# Altium schematic symbol library GyokuRe.SchLib: 1131 symbols (part 5 of 8)
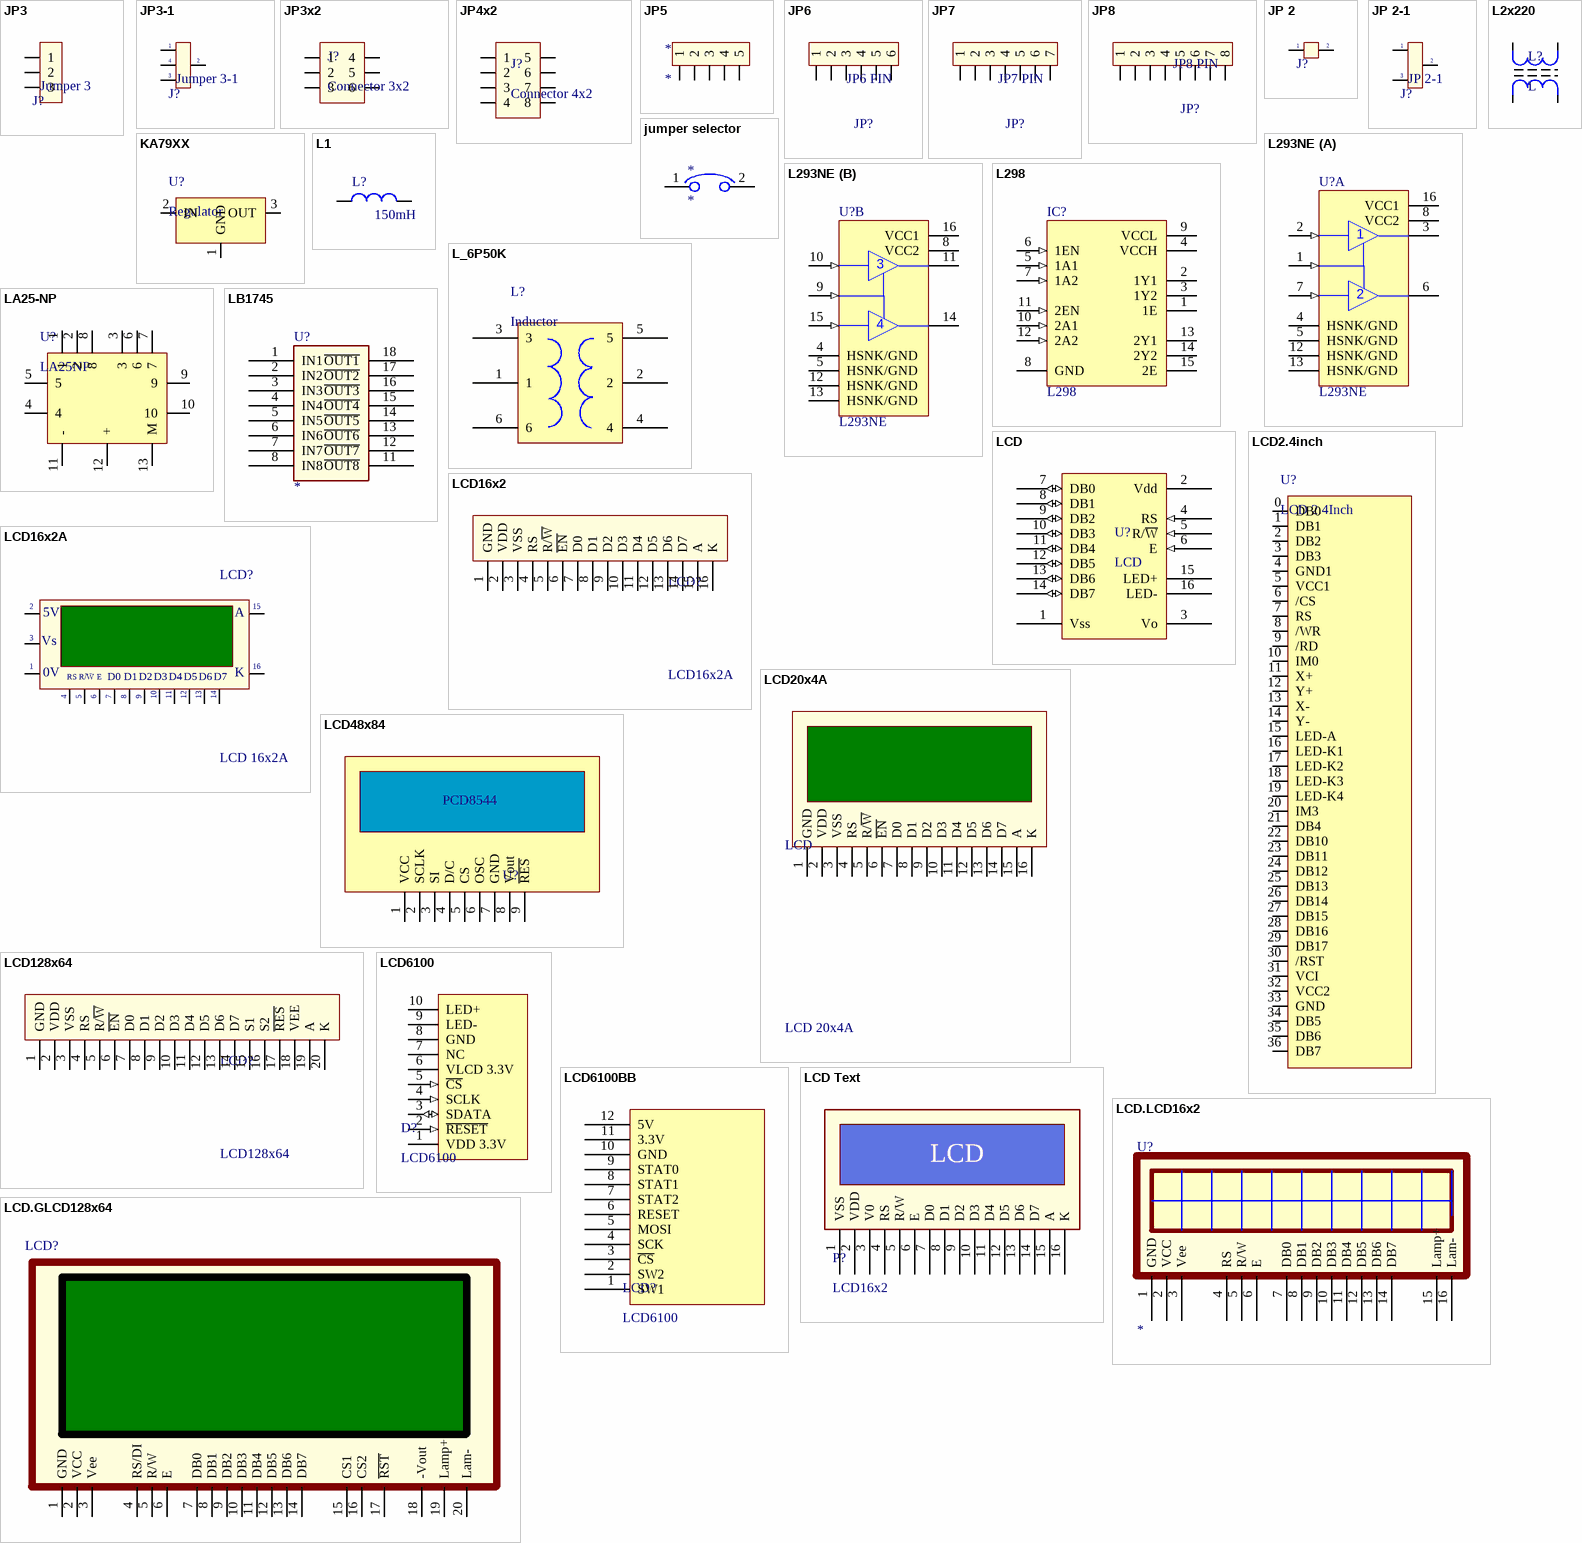
[diagram p53: symbols JP3 to LCD.LCD16x2]

## JP3-1
designator J?, comment Jumper 3-1
Value: J3-1
footprint J3-1 (Jumper 4)
pins: 1, 2, 3, 4

## JP3x2
designator J?, comment Connector 3x2
Value: Connector 3x2
footprint JP3x2 (Connector 3x2)
pins: 1, 2, 3, 4, 5, 6

## JP4x2
designator J?, comment Connector 4x2
Value: Connector 4x2
footprint JP4x2 (Connector 4x2)
pins: 1, 2, 3, 4, 5, 6, 7, 8

## JP5
designator *
footprint JP5
footprint JP5H
pins: 1, 2, 3, 4, 5

## JP6
designator JP?, comment JP6 PIN
Value: JP7
footprint JP6
footprint JP6H
pins: 1, 2, 3, 4, 5, 6

## JP7
designator JP?, comment JP7 PIN
Value: JP7
footprint JP7
footprint JP7H
pins: 1, 2, 3, 4, 5, 6, 7

## JP8
designator JP?, comment JP8 PIN
Value: JP7
footprint JP8
footprint JP8H
pins: 1, 2, 3, 4, 5, 6, 7, 8

## JP 2
designator J?, comment Jumper 2  (value not drawn)
Value: JP 2
footprint JP2
footprint jp2h
pins: 1, 2

## JP 2-1
designator J?
Jumper 2-1; Value: J2-1
footprint JP3 (Jumper 3)
pins: 1, 2, 3

## jumper selector
designator *
pins: 1, 2

## KA79XX
designator U?, comment Regulator
footprint TO-220
pins: 1 GND, 2 IN, 3 OUT

## L1
designator L?, comment 150mH
Inductor; Value: 150 mH
footprint L/0.4 (Inductor , 2 Pin, L 350mil, W 150 mil)
footprint L01 (Inductor)
pins: 1, 2

## L2x220
designator L?, comment L
Inductor; Value: Loc 220; Designed by: VanDungEvn
footprint L2x220
pins: 1, 2, 3, 4

## L293NE
designator U?
Quadruple Half-H Driver; Published: 15-May-2002; LatestRevisionDate: 04-Mar-2005; LatestRevisionNote: Stylized 3D Model Added.; DatasheetVersion: May-1990; PackageVersion: 1991; PackageReference: NE016; Publisher: Altium Limited; PackageDescription: DIP; 16 Leads; Row Spacing 7.62 mm; Pitch 2.54 mm; Code_JEDEC: MS-001-BB; ComponentLink1Description: Manufacturer Link; ComponentLink1URL: http://www.ti.com/; ComponentLink2Description: Datasheet; ComponentLink2URL: http://www-s.ti.com/sc/ds/l293.pdf
footprint DIP16/W0.3 (16 PIN, W 300mil, Pin to pin 100mil)
pins on every part: 4 HSNK/GND (power), 5 HSNK/GND (power), 8 VCC2 (power), 12 HSNK/GND (power), 13 HSNK/GND (power), 16 VCC1 (power)
part A pins: 1 1,2EN (in), 2 1A (in), 3 1Y (hiz), 6 2Y (hiz), 7 2A (in)
part B pins: 9 3,4EN (in), 10 3A (in), 11 3Y (hiz), 14 4Y (hiz), 15 4A (in)

## L298
designator IC?
Dual Full-H Driver; Note: The tab is elec is connected to GND pin; Published: 15-May-2002; DatasheetVersion: Jun-1990; PackageReference: KV015; Publisher: Altium Limited; PackageDescription: TO, Thru-Hole, Vertical, Heatsink Mounted; 15 Bent Staggered Leads; Pitch 1.27 mm; ComponentLink1Description: Manufacturer Link; ComponentLink1URL: http://www.ti.com/
footprint DIP15SL2 (TO, Thru-Hole, Vertical, Heatsink Mounted; 15 Bent Staggered Leads; Pitch 1.27 mm)
pins: 1 1E, 2 1Y1 (hiz), 3 1Y2 (hiz), 4 VCCH (power), 5 1A1 (in), 6 1EN (in), 7 1A2 (in), 8 GND (power), 9 VCCL (power), 10 2A1 (in), 11 2EN (in), 12 2A2 (in), 13 2Y1 (hiz), 14 2Y2 (hiz), 15 2E

## L_6P50K
designator L?, comment Inductor
footprint L_6P50K
pins: 1, 2, 3, 4, 5, 6

## LA25-NP
designator U?, comment LA25NP
footprint LA25NP (Current sensor 25A)
pins: 1, 2, 3, 4, 5, 6, 7, 8, 9, 10, 11 -, 12 +, 13 M

## LB1745
designator U?
Vendor: Digikey; Published: 13-April-2009; Publisher: Hoang Nguyen; ComponentLink1Description: Digikey Part Link; ComponentLink2Description: Open Datasheet; ComponentLink2URL: H:\LIBRARY\LIBRARY.Datasheet\
footprint DIP18
pins: 1 IN1, 2 IN2, 3 IN3, 4 IN4, 5 IN5, 6 IN6, 7 IN7, 8 IN8, 9 VCC (power) hidden to VCC, 10 GND (power) hidden to GND, 11 ~{OUT8}, 12 ~{OUT7}, 13 ~{OUT6}, 14 ~{OUT5}, 15 ~{OUT4}, 16 ~{OUT3}, 17 ~{OUT2}, 18 ~{OUT1}

## LCD
designator U?
Character LCD, HD44780, 16-pin
footprint LCD-16x2 (Character LCD; 16x2; Solder Pad 35mil)
footprint LCD-20x2 (Character LCD; 20x2; Solder Pad 35mil)
pins: 1 Vss, 2 Vdd, 3 Vo, 4 RS (in), 5 R/~{W} (in), 6 E (in), 7 DB0 (io), 8 DB1 (io), 9 DB2 (io), 10 DB3 (io), 11 DB4 (io), 12 DB5 (io), 13 DB6 (io), 14 DB7 (io), 15 LED+, 16 LED-

## LCD2.4inch
designator U?, comment LCD 2.4Inch
footprint LCD2.4inch (www.wandisplay.com - KWH024Q04)
pins: 0 DB0, 1 DB1, 2 DB2, 3 DB3, 4 GND1, 5 VCC1, 6 /CS, 7 RS, 8 /WR, 9 /RD, 10 IM0, 11 X+, 12 Y+, 13 X-, 14 Y-, 15 LED-A, 16 LED-K1, 17 LED-K2, 18 LED-K3, 19 LED-K4, 20 IM3, 21 DB4, 22 DB10, 23 DB11, 24 DB12, 25 DB13, 26 DB14, 27 DB15, 28 DB16, 29 DB17, 30 /RST, 31 VCI, 32 VCC2, 33 GND, 34 DB5, 35 DB6, 36 DB7

## LCD16x2
designator LCD?, comment LCD16x2A
LCD dipslay 16 char, 2 line; Value: LCD16x2A
footprint LCD16X2N (LCD dipslay 16x2, 16 pin)
footprint LCD16X2 (LCD dipslay 16x2, 16 pin)
pins: 1 GND, 2 VDD, 3 VSS, 4 RS, 5 R/~{W}, 6 ~{EN}, 7 D0, 8 D1, 9 D2, 10 D3, 11 D4, 12 D5, 13 D6, 14 D7, 15 A, 16 K

## LCD16x2A
designator LCD?, comment LCD 16x2A
LCD dipslay 16 char, 2 line; Value: LCD16x2A
footprint LCD16X2 (LCD dipslay 16x2, 16 pin)
footprint LCD16X2N (LCD dipslay 16x2, 16 pin)
pins: 1 GND, 2 VDD, 3 VEE, 4 RS, 5 R/~{W}, 6 ~{EN}, 7 D0, 8 D1, 9 D2, 10 D3, 11 D4, 12 D5, 13 D6, 14 D7, 15 A, 16 K
text: 5V; Vs; |; 0V; R/W; E

## LCD20x4A
designator LCD, comment LCD 20x4A
LCD dipslay 20 char, 4 line; Value: Jum 40; Value: LCD 20x4A
footprint LCD20X4A (LCD dipslay 20x4, 16 pin)
pins: 1 GND, 2 VDD, 3 VSS, 4 RS, 5 R/~{W}, 6 ~{EN}, 7 D0, 8 D1, 9 D2, 10 D3, 11 D4, 12 D5, 13 D6, 14 D7, 15 A, 16 K

## LCD48x84
designator U?, comment PCD8544
LCD Graphic; Value: PCD8544
footprint CON9
pins: 1 VCC, 2 SCLK, 3 SI, 4 D/C, 5 CS, 6 OSC, 7 GND, 8 Vout, 9 ~{RES}

## LCD128x64
designator LCD?
LCD Graphic 128x64; Value: LCD 128x64
footprint LCD128x64 (LCD Graphic 128x64, 20 pin)
pins: 1 GND, 2 VDD, 3 VSS, 4 RS, 5 R/~{W}, 6 ~{EN}, 7 D0, 8 D1, 9 D2, 10 D3, 11 D4, 12 D5, 13 D6, 14 D7, 15 S1, 16 S2, 17 ~{RES}, 18 VEE, 19 A, 20 K

## LCD6100
designator D?
GLCD 132 pixel x 132 pixel - 4096 color
pins: 1 VDD 3.3V (power), 2 ~{RESET} (in), 3 SDATA (io), 4 SCLK (in), 5 ~{CS} (in), 6 VLCD 3.3V (power), 7 NC, 8 GND (power), 9 LED- (power), 10 LED+ (power)

## LCD6100BB
designator LCD?, comment LCD6100
footprint HDR1X12 (Connector; Header; 12 Position)
pins: 1 SW1, 2 SW2, 3 ~{CS}, 4 SCK, 5 MOSI, 6 RESET, 7 STAT2, 8 STAT1, 9 STAT0, 10 GND, 11 3.3V, 12 5V

## LCD Text
designator P?, comment LCD16x2
footprint LCD16X2 (LCD 16x2)
footprint HDR1X16 (Connector; Header; 16 Position)
pins: 1 VSS, 2 VDD, 3 V0, 4 RS, 5 R/W, 6 E, 7 D0, 8 D1, 9 D2, 10 D3, 11 D4, 12 D5, 13 D6, 14 D7, 15 A, 16 K
text: LCD

## LCD.GLCD128x64
designator LCD?, comment GLCD128x64  (value not drawn)
Graphic LCD 128x64pixel; Price: 250.000VND; ComponentLink2Description: Open Datasheet; ComponentLink2URL: H:\LIBRARY\LIBRARY.Datasheet\
footprint LCD128x64 (Graphic LCD 128x64)
pins: 1 GND, 2 VCC, 3 Vee, 4 RS/DI, 5 R/W, 6 E, 7 DB0, 8 DB1, 9 DB2, 10 DB3, 11 DB4, 12 DB5, 13 DB6, 14 DB7, 15 CS1, 16 CS2, 17 ~{RST}, 18 -Vout, 19 Lamp+, 20 Lam-

## LCD.LCD16x2
designator U?
LCD 2 line 16 charactors; Vendor: Digikey; Published: 13-April-2009; Publisher: Hoang Nguyen; ComponentLink1Description: Digikey Part Link; ComponentLink2Description: Open Datasheet; ComponentLink2URL: H:\LIBRARY\LIBRARY.Datasheet\; Price: 65000VND
3D model 162a (PCB3D Model)
footprint LCD16x2 (Character LCD 16x2)
footprint 162A-SlottedPlastic (LCD and Mounting Moulding)
footprint LCD connector (Character LCD 16x2)
pins: 1 GND, 2 VCC, 3 Vee, 4 RS, 5 R/W, 6 E, 7 DB0, 8 DB1, 9 DB2, 10 DB3, 11 DB4, 12 DB5, 13 DB6, 14 DB7, 15 Lamp+, 16 Lam-

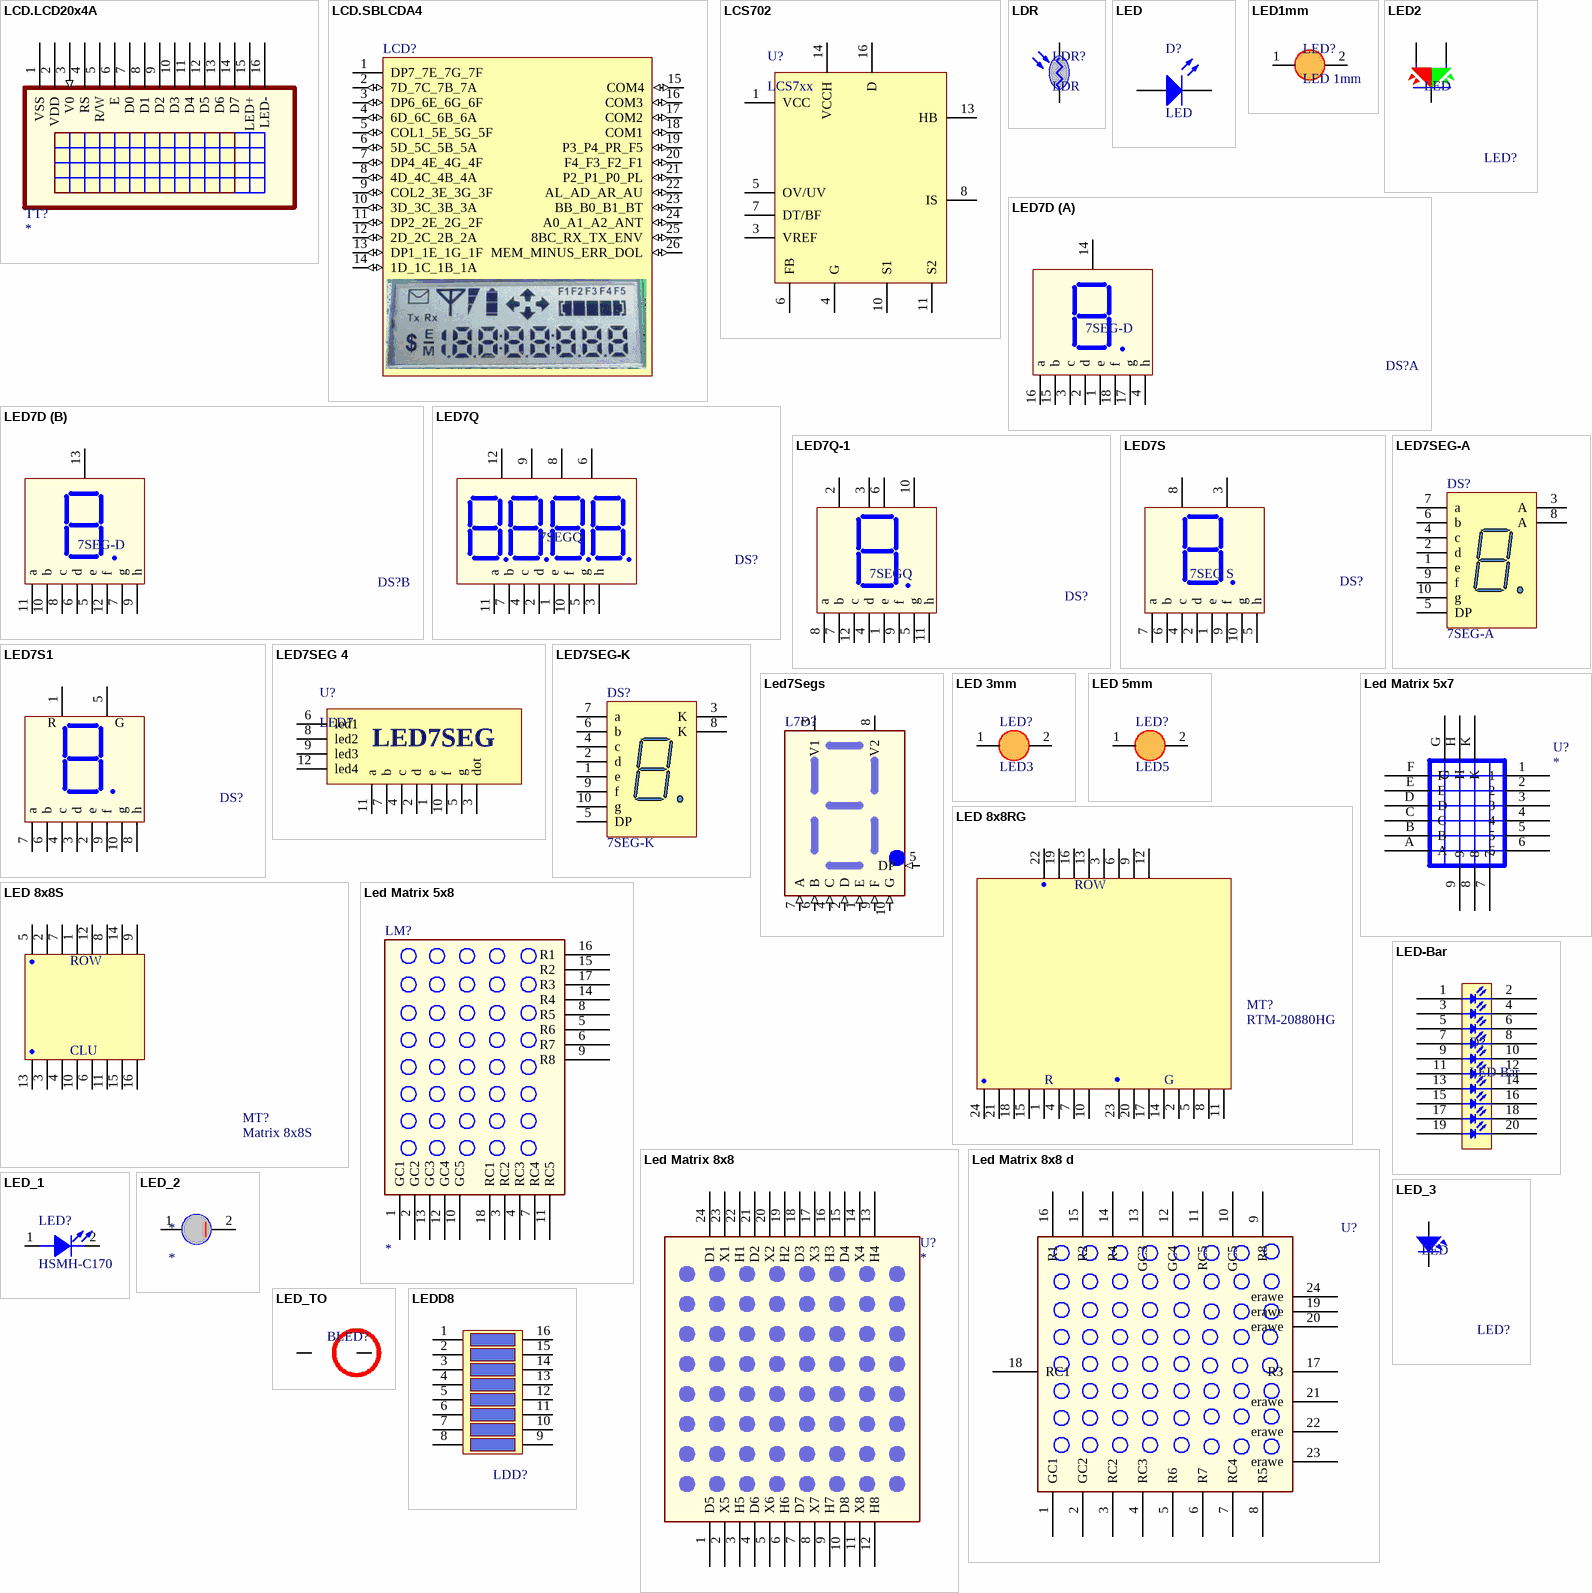
[diagram p26: symbols LCD.LCD20x4A to LEDD8]

## LCD.LCD20x4A
designator TT?
LCD 4 line 20 charactors; Vendor: Digikey; Published: 13-April-2009; Publisher: Hoang Nguyen; ComponentLink1Description: Digikey Part Link; ComponentLink2Description: Open Datasheet; ComponentLink2URL: H:\LIBRARY\LIBRARY.Datasheet\
pins: 1 VSS (power), 2 VDD (power), 3 V0 (in), 4 RS, 5 R/W, 6 E, 7 D0, 8 D1, 9 D2, 10 D3, 11 D4, 12 D5, 13 D6, 14 D7, 15 LED+, 16 LED-

## LCD.SBLCDA4
designator LCD?  (value not drawn)
SoftBaugh LCD A4; Vendor: Digikey; Publisher: Hoang Nguyen; ComponentLink2Description: Open Datasheet; ComponentLink2URL: H:\LIBRARY\LIBRARY.Datasheet\SBLCDA4_Specification.pdf; Published: 13-April-2009; ComponentLink1Description: Digikey Part Link; Manufacturer: www.softbaugh.com
footprint SBLCDA4 (SoftBaugh LCD A4)
pins: 1 DP7_7E_7G_7F, 2 7D_7C_7B_7A (io), 3 DP6_6E_6G_6F (io), 4 6D_6C_6B_6A (io), 5 COL1_5E_5G_5F (io), 6 5D_5C_5B_5A (io), 7 DP4_4E_4G_4F (io), 8 4D_4C_4B_4A (io), 9 COL2_3E_3G_3F (io), 10 3D_3C_3B_3A (io), 11 DP2_2E_2G_2F (io), 12 2D_2C_2B_2A (io), 13 DP1_1E_1G_1F (io), 14 1D_1C_1B_1A (io), 15 COM4 (io), 16 COM3 (io), 17 COM2 (io), 18 COM1 (io), 19 P3_P4_PR_F5 (io), 20 F4_F3_F2_F1 (io), 21 P2_P1_P0_PL (io), 22 AL_AD_AR_AU (io), 23 BB_B0_B1_BT (io), 24 A0_A1_A2_ANT (io), 25 8BC_RX_TX_ENV (io), 26 MEM_MINUS_ERR_DOL (io)

## LCS702
designator U?, comment LCS7xx
footprint LCS7xx (LLC controller)
pins: 1 VCC, 3 VREF, 4 G, 5 OV/UV, 6 FB, 7 DT/BF, 8 IS, 10 S1, 11 S2, 13 HB, 14 VCCH, 16 D

## LDR
designator LDR?
Quang Tro
footprint CDS (Footprint not found)
pins: 1 A, 2 K

## LED
designator D?
Typical LED; Published: 8-Jun-2000; LatestRevisionDate: 08-Jul-2005; LatestRevisionNote: Mech Layer 1 removed.; PackageReference: LED-1; Publisher: Altium Limited
footprint LED-1 GREEN (Typical LED; GREEN; 2 Leads; Solder Pad 35mil)
footprint LED-1 RED (Typical LED; RED; 2 Leads; Solder Pad 35mil)
footprint LED-1 YELLOW (Typical LED; YELLOW; 2 Leads; Solder Pad 35mil)
footprint LED-0 3mm GREEN (Typical LED; GREEN; RED; 2 Leads; Solder Pad 35mil)
footprint LED-0 3mm RED (Typical LED; RED; 2 Leads; Solder Pad 35mil)
footprint LED-0 3mm YELLOW (Typical LED; YELLOW; RED; 2 Leads; Solder Pad 35mil)
footprint LED-0 5mm BLUE (Typical LED; BLUE; 2 Leads; Solder Pad 35mil)
footprint LED-0 5mm GREEN (Typical LED; GREEN; 2 Leads; Solder Pad 35mil)
footprint LED-0 5mm ORANGE (Typical LED; ORANGE; 2 Leads; Solder Pad 35mil)
footprint LED-0 5mm RED (Typical LED; RED; 2 Leads; Solder Pad 35mil)
footprint LED-0 5mm YELLOW (Typical LED; YELLOW; 2 Leads; Solder Pad 35mil)
footprint LED-0805 BLUE (Chip LED; BLUE; Body 2.0 x 1.3 mm (LxW typ) [2012])
footprint LED-0805 GREEN (Chip LED; GREEN; Body 2.0 x 1.3 mm (LxW typ) [2012])
footprint LED-0805 ORANGE (Chip LED; ORANGE; Body 2.0 x 1.3 mm (LxW typ) [2012])
footprint LED-0805 RED (Chip LED; RED; Body 2.0 x 1.3 mm (LxW typ) [2012])
footprint LED-0805 YELLOW (Chip LED; YELLOW; Body 2.0 x 1.3 mm (LxW typ) [2012])
pins: 1 A, 2 K

## LED1mm
designator LED?, comment LED 1mm
footprint HDR1X2
pins: 1 A, 2 K

## LED2
designator LED?, comment LED
LED 2 colour Green and Red; Value: LED 3 - 5 ly 2 Colour
footprint LED-32 (LED 3 PIN, 3ly Two colour)
footprint LED-52 (LED 3 PIN, 5 ly , Two colour)
pins: 1, 2, 3

## LED7D
designator DS?, comment 7SEG-D
Two 7 Seg Dipslay; Value: LED 7D SEG
footprint 7SEGD (DIP 18Leads; Body 24 x 15 mm; Pitch 0.5 mm)
part A pins: 1 e, 2 d, 3 c, 4 h, 14 V1, 15 b, 16 a, 17 g, 18 f
part B pins: 5 e, 6 d, 7 g, 8 c, 9 h, 10 b, 11 a, 12 f, 13 V2

## LED7Q
designator DS?, comment 7SEGQ
Four 7 Seg Dipslay; Value: LED 7Q SEG
footprint 7SEGQ (DIP 12 Leads; Body 48 x 20 mm; Pitch 0.5 mm)
pins: 1 e, 2 d, 3 h, 4 c, 5 g, 6 V4, 7 b, 8 V3, 9 V2, 10 f, 11 a, 12 V1

## LED7Q-1
designator DS?, comment 7SEGQ
Four 7 Seg Dipslay; Value: LED 7Q SEG
footprint 7SEGQ (DIP 12 Leads; Body 48 x 20 mm; Pitch 0.5 mm)
pins: 1 e, 2 V1, 3 V2, 4 d, 5 g, 6 V3, 7 b, 8 a, 9 f, 10 V4, 11 h, 12 c

## LED7S
designator DS?, comment 7SEG S
Single 7 Seg Dipslay; Value: LED 7S SEG
footprint 7SEGS (DIP 10 Leads; Body 12 x 15 mm; Pitch 0.5 mm)
pins: 1 e, 2 d, 3 Vcc, 4 c, 5 h, 6 b, 7 a, 8 Vcc, 9 f, 10 g

## LED7S1
designator DS?, comment 7SEG S  (value not drawn)
Single 7 Seg Dipslay 29x41 mm; Value: LED 7S SEG
footprint 7SEG_29x41 (DIP 10 Leads; Body 29 x 41 mm; Pitch 0.5 mm)
footprint 7SEG_37x55 (DIP 10 Leads; Body 29 x 41 mm; Pitch 0.5 mm)
pins: 1 R, 2 e, 3 d, 4 c, 5 COM, 6 b, 7 a, 8 h, 9 f, 10 g
text: G

## LED7SEG 4
designator U?, comment LED7
footprint LED7MINI (oki)
pins: 1 e, 2 d, 3 dot, 4 c, 5 g, 6 led1, 7 b, 8 led2, 9 led3, 10 f, 11 a, 12 led4
text: LED7SEG

## LED7SEG-A
designator DS?, comment 7SEG-A
14.2 mm General Purpose Blue 7-Segment Display: CA, RH DP, Gray Surface; MinimumIntensity: 2020 ucd; Note: IF = 10 mA; Published: 8-Jun-2000; LatestRevisionDate: 17-Dec-2003; LatestRevisionNote: Schematic revised, PCB Footprint replaced.; DatasheetDocument: 24-Sep-2002; PackageDocument: 24-Sep-2002; PackageReference: H; Publisher: Altium Limited; Colour: Blue; ComponentLink1Description: Manufacturer Link; ComponentLink1URL: http://www.agilent.com/
footprint LED7SEG
pins: 1 e "Cathode", 2 d "Cathode", 3 A "Common Anode", 4 c "Cathode", 5 DP "Cathode", 6 b "Cathode", 7 a "Cathode", 8 A "Common Anode", 9 f "Cathode", 10 g "Cathode"

## LED7SEG-K
designator DS?, comment 7SEG-K
14.2 mm General Purpose Blue 7-Segment Display: CC, RH DP, Gray Surface; MinimumIntensity: 2020 ucd; Note: IF = 10 mA; Published: 8-Jun-2000; LatestRevisionDate: 17-Dec-2003; LatestRevisionNote: Schematic revised, PCB Footprint replaced.; DatasheetDocument: 24-Sep-2002; PackageDocument: 24-Sep-2002; PackageReference: H; Publisher: Altium Limited; Colour: Blue; ComponentLink1Description: Manufacturer Link; ComponentLink1URL: http://www.agilent.com/
footprint LED7SEG
pins: 1 e "Anode", 2 d "Anode", 3 K "Common Cathode", 4 c "Anode", 5 DP "Anode", 6 b "Anode", 7 a "Anode", 8 K "Common Cathode", 9 f "Anode", 10 g "Anode"

## Led7Segs
designator L7D?  (value not drawn)
Led 7 doan; Vendor: Digikey; Published: 13-April-2009; Publisher: Hoang Nguyen; ComponentLink1Description: Digikey Part Link; ComponentLink2Description: Open Datasheet; ComponentLink2URL: H:\LIBRARY\LIBRARY.Datasheet\
footprint led7seg (led 7 doan)
footprint Led7seg small
pins: 1 E (in), 2 D (in), 3 V1 (power), 4 C (in), 5 DP (in), 6 B (in), 7 A (in), 8 V2 (power), 9 F (in), 10 G (in)

## LED 3mm
designator LED?, comment LED3
LED 3mm
footprint LED3mm
pins: 1 A, 2 K

## LED 5mm
designator LED?, comment LED5
LED 5mm
footprint LED5MM
pins: 1 A, 2 K

## LED 8x8RG
designator MT?, comment RTM-20880HG
Matrix 8x8, Two colour; Value: Matrix 8x8 two colour
footprint 8x8RG (Matran 8x8 2mau,Body 60 X 60mm)
pins: 1 R5, 2 G5, 3 H5, 4 R6, 5 G6, 6 H6, 7 R7, 8 G7, 9 H7, 10 R8, 11 G8, 12 H8, 13 H4, 14 G4, 15 R4, 16 H3, 17 G3, 18 R3, 19 H2, 20 G2, 21 R2, 22 H1, 23 G1, 24 R1
text: ROW; R; G

## LED 8x8S
designator MT?, comment Matrix 8x8S
Matrix 8x8,  Single colour; Value: Matrix 8x8S
footprint 8x8S (Matran 8x8, Body 60 X 60mm)
pins: 1 H4, 2 H2, 3 C2, 4 C3, 5 H1, 6 C5, 7 H3, 8 H6, 9 H8, 10 C4, 11 C6, 12 H5, 13 C1, 14 H7, 15 C7, 16 C8
text: ROW; CLU

## Led Matrix 5x7
designator U?
Vendor: Digikey; Published: 13-April-2009; Publisher: Hoang Nguyen; ComponentLink1Description: Digikey Part Link; ComponentLink2Description: Open Datasheet; ComponentLink2URL: H:\LIBRARY\LIBRARY.Datasheet\
pins: 1, 2, 3, 4, 5, 6, 7, 8, 9, A, B, C, D, E, F, G, H, K

## Led Matrix 5x8
designator LM?
Vendor: Digikey; Published: 13-April-2009; Publisher: Hoang Nguyen; ComponentLink1Description: Digikey Part Link; ComponentLink2Description: Open Datasheet; ComponentLink2URL: H:\LIBRARY\LIBRARY.Datasheet\
footprint LEDMATRIX_5x8
pins: 1 GC1, 2 GC2, 3 RC2, 4 RC3, 5 R6, 6 R7, 7 RC4, 8 R5, 9 R8, 10 GC5, 11 RC5, 12 GC4, 13 GC3, 14 R4, 15 R2, 16 R1, 17 R3, 18 RC1

## Led Matrix 8x8
designator U?
Vendor: Digikey; Published: 13-April-2009; Publisher: Hoang Nguyen; ComponentLink1Description: Digikey Part Link; ComponentLink2Description: Open Datasheet; ComponentLink2URL: H:\LIBRARY\LIBRARY.Datasheet\
pins: 1 D5, 2 X5, 3 H5, 4 D6, 5 X6, 6 H6, 7 D7, 8 X7, 9 H7, 10 D8, 11 X8, 12 H8, 13 H4, 14 X4, 15 D4, 16 H3, 17 X3, 18 D3, 19 H2, 20 X2, 21 D2, 22 H1, 23 X1, 24 D1

## Led Matrix 8x8 d
designator U?  (value not drawn)
Led Matric; Vendor: Digikey; Published: 13-April-2009; Publisher: Hoang Nguyen; ComponentLink1Description: Digikey Part Link; ComponentLink2Description: Open Datasheet; ComponentLink2URL: H:\LIBRARY\LIBRARY.Datasheet\
footprint LEDMATRIX_5x8
pins: 1 GC1, 2 GC2, 3 RC2, 4 RC3, 5 R6, 6 R7, 7 RC4, 8 R5, 9 R8, 10 GC5, 11 RC5, 12 GC4, 13 GC3, 14 R4, 15 R2, 16 R1, 17 R3, 18 RC1, 19 erawe, 20 erawe, 21 erawe, 22 erawe, 23 erawe, 24 erawe

## LED-Bar
designator D?, comment LED Bar
10 LED, Bar
footprint LED-Bar (LED Bar; 10 Indicator; Solder Pad 35mil)
pins: 1, 2, 3, 4, 5, 6, 7, 8, 9, 10, 11, 12, 13, 14, 15, 16, 17, 18, 19, 20

## LED_1
designator LED?, comment HSMH-C170
Typical GaAs SMD LED; Manufacturer: Lite-On Inc; Color: RED; Type: Cong ty RP; Vendor: Digikey; Publisher: Hoang Nguyen; Price: *; Published: 13-April-2009; ComponentLink1Description: Digikey Part Link; ComponentLink2Description: Open Datasheet; ComponentLink2URL: H:\LIBRARY\LIBRARY.Datasheet\
footprint LED.SMD.GREEN
footprint LED.SMD.RED
footprint LED.SMD.WHITE
footprint Led 3mm
footprint Led 3mm 1 (Led 3mm)
footprint Led 5mm
footprint Led 3mm_2 (Led 3mm)
pins: 1 A, 2 K

## LED_2
designator *
pins: 1 A, 2 K

## LED_3
designator LED?, comment LED